# Altium footprint library IC.PcbLib: 386 footprints (part 9 of 30)
Each footprint in its own frame and in the unit in brackets; x right, y up, seen from the top. Pads: shape width x height; smd on the part's side, far side on the other; paste and mask are expansions set on the pad; w line width, h text height; cw(c..) or ccw(c..) is an arc to the next point about the centre after c.
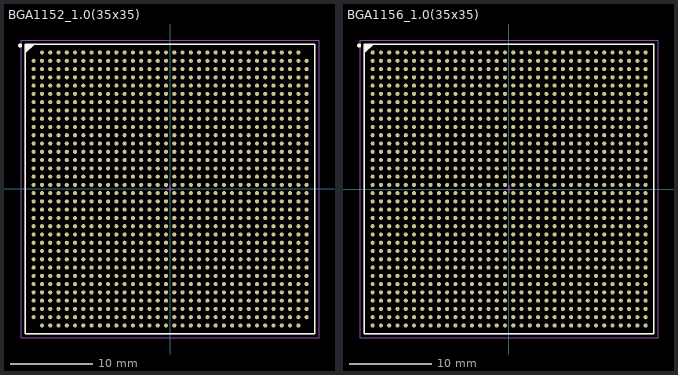
[diagram p8: the footprints below, top view; thin cyan lines are the x and y axes]

## BGA1152_1.0(35x35) [mm]
pads (1152):
  round 0.5 smd: A2(-15.5,16.475) A3(-14.5,16.475) A4(-13.5,16.475) A5(-12.5,16.475) A6(-11.5,16.475) A7(-10.5,16.475) A8(-9.5,16.475) A9(-8.5,16.475) A10(-7.5,16.475) A11(-6.5,16.475) A12(-5.5,16.475) A13(-4.5,16.475) A14(-3.5,16.475) A15(-2.5,16.475) A16(-1.5,16.475) A17(-0.5,16.475) A18(0.5,16.475) A19(1.5,16.475) A20(2.5,16.475) A21(3.5,16.475) A22(4.5,16.475) A23(5.5,16.475) A24(6.5,16.475) A25(7.5,16.475) A26(8.5,16.475) A27(9.5,16.475) A28(10.5,16.475) A29(11.5,16.475) A30(12.5,16.475) A31(13.5,16.475) A32(14.5,16.475) A33(15.5,16.475) AA1(-16.5,-3.525) AA2(-15.5,-3.525) AA3(-14.5,-3.525) AA4(-13.5,-3.525) AA5(-12.5,-3.525) AA6(-11.5,-3.525) AA7(-10.5,-3.525) AA8(-9.5,-3.525) AA9(-8.5,-3.525) AA10(-7.5,-3.525) AA11(-6.5,-3.525) AA12(-5.5,-3.525) AA13(-4.5,-3.525) AA14(-3.5,-3.525) AA15(-2.5,-3.525) AA16(-1.5,-3.525) AA17(-0.5,-3.525) AA18(0.5,-3.525) AA19(1.5,-3.525) AA20(2.5,-3.525) AA21(3.5,-3.525) AA22(4.5,-3.525) AA23(5.5,-3.525) AA24(6.5,-3.525) AA25(7.5,-3.525) AA26(8.5,-3.525) AA27(9.5,-3.525) AA28(10.5,-3.525) AA29(11.5,-3.525) AA30(12.5,-3.525) AA31(13.5,-3.525) AA32(14.5,-3.525) AA33(15.5,-3.525) AA34(16.5,-3.525) AB1(-16.5,-4.525) AB2(-15.5,-4.525) AB3(-14.5,-4.525) AB4(-13.5,-4.525) AB5(-12.5,-4.525) AB6(-11.5,-4.525) AB7(-10.5,-4.525) AB8(-9.5,-4.525) AB9(-8.5,-4.525) AB10(-7.5,-4.525) AB11(-6.5,-4.525) AB12(-5.5,-4.525) AB13(-4.5,-4.525) AB14(-3.5,-4.525) AB15(-2.5,-4.525) AB16(-1.5,-4.525) AB17(-0.5,-4.525) AB18(0.5,-4.525) AB19(1.5,-4.525) AB20(2.5,-4.525) AB21(3.5,-4.525) AB22(4.5,-4.525) AB23(5.5,-4.525) AB24(6.5,-4.525) AB25(7.5,-4.525) AB26(8.5,-4.525) AB27(9.5,-4.525) AB28(10.5,-4.525) AB29(11.5,-4.525) AB30(12.5,-4.525) AB31(13.5,-4.525) AB32(14.5,-4.525) AB33(15.5,-4.525) AB34(16.5,-4.525) AC1(-16.5,-5.525) AC2(-15.5,-5.525) AC3(-14.5,-5.525) AC4(-13.5,-5.525) AC5(-12.5,-5.525) AC6(-11.5,-5.525) AC7(-10.5,-5.525) AC8(-9.5,-5.525) AC9(-8.5,-5.525) AC10(-7.5,-5.525) AC11(-6.5,-5.525) AC12(-5.5,-5.525) AC13(-4.5,-5.525) AC14(-3.5,-5.525) AC15(-2.5,-5.525) AC16(-1.5,-5.525) AC17(-0.5,-5.525) AC18(0.5,-5.525) AC19(1.5,-5.525) AC20(2.5,-5.525) AC21(3.5,-5.525) AC22(4.5,-5.525) AC23(5.5,-5.525) AC24(6.5,-5.525) AC25(7.5,-5.525) AC26(8.5,-5.525) AC27(9.5,-5.525) AC28(10.5,-5.525) AC29(11.5,-5.525) AC30(12.5,-5.525) AC31(13.5,-5.525) AC32(14.5,-5.525) AC33(15.5,-5.525) AC34(16.5,-5.525) AD1(-16.5,-6.525) AD2(-15.5,-6.525) AD3(-14.5,-6.525) AD4(-13.5,-6.525) AD5(-12.5,-6.525) AD6(-11.5,-6.525) AD7(-10.5,-6.525) AD8(-9.5,-6.525) AD9(-8.5,-6.525) AD10(-7.5,-6.525) AD11(-6.5,-6.525) AD12(-5.5,-6.525) AD13(-4.5,-6.525) AD14(-3.5,-6.525) AD15(-2.5,-6.525) AD16(-1.5,-6.525) AD17(-0.5,-6.525) AD18(0.5,-6.525) AD19(1.5,-6.525) AD20(2.5,-6.525) AD21(3.5,-6.525) AD22(4.5,-6.525) AD23(5.5,-6.525) AD24(6.5,-6.525) AD25(7.5,-6.525) AD26(8.5,-6.525) AD27(9.5,-6.525) AD28(10.5,-6.525) AD29(11.5,-6.525) AD30(12.5,-6.525) AD31(13.5,-6.525) AD32(14.5,-6.525) AD33(15.5,-6.525) AD34(16.5,-6.525) AE1(-16.5,-7.525) AE2(-15.5,-7.525) AE3(-14.5,-7.525) AE4(-13.5,-7.525) AE5(-12.5,-7.525) AE6(-11.5,-7.525) AE7(-10.5,-7.525) AE8(-9.5,-7.525) AE9(-8.5,-7.525) AE10(-7.5,-7.525) AE11(-6.5,-7.525) AE12(-5.5,-7.525) AE13(-4.5,-7.525) AE14(-3.5,-7.525) AE15(-2.5,-7.525) AE16(-1.5,-7.525) AE17(-0.5,-7.525) AE18(0.5,-7.525) AE19(1.5,-7.525) AE20(2.5,-7.525) AE21(3.5,-7.525) AE22(4.5,-7.525) AE23(5.5,-7.525) AE24(6.5,-7.525) AE25(7.5,-7.525) AE26(8.5,-7.525) AE27(9.5,-7.525) AE28(10.5,-7.525) AE29(11.5,-7.525) AE30(12.5,-7.525) AE31(13.5,-7.525) AE32(14.5,-7.525) AE33(15.5,-7.525) AE34(16.5,-7.525) AF1(-16.5,-8.525) AF2(-15.5,-8.525) AF3(-14.5,-8.525) AF4(-13.5,-8.525) AF5(-12.5,-8.525) AF6(-11.5,-8.525) AF7(-10.5,-8.525) AF8(-9.5,-8.525) AF9(-8.5,-8.525) AF10(-7.5,-8.525) AF11(-6.5,-8.525) AF12(-5.5,-8.525) AF13(-4.5,-8.525) AF14(-3.5,-8.525) AF15(-2.5,-8.525) AF16(-1.5,-8.525) AF17(-0.5,-8.525) AF18(0.5,-8.525) AF19(1.5,-8.525) AF20(2.5,-8.525) AF21(3.5,-8.525) AF22(4.5,-8.525) AF23(5.5,-8.525) AF24(6.5,-8.525) AF25(7.5,-8.525) AF26(8.5,-8.525) AF27(9.5,-8.525) AF28(10.5,-8.525) AF29(11.5,-8.525) AF30(12.5,-8.525) AF31(13.5,-8.525) AF32(14.5,-8.525) AF33(15.5,-8.525) AF34(16.5,-8.525) AG1(-16.5,-9.525) AG2(-15.5,-9.525) AG3(-14.5,-9.525) AG4(-13.5,-9.525) AG5(-12.5,-9.525) AG6(-11.5,-9.525) AG7(-10.5,-9.525) AG8(-9.5,-9.525) AG9(-8.5,-9.525) AG10(-7.5,-9.525) AG11(-6.5,-9.525) AG12(-5.5,-9.525) AG13(-4.5,-9.525) AG14(-3.5,-9.525) AG15(-2.5,-9.525) AG16(-1.5,-9.525) AG17(-0.5,-9.525) AG18(0.5,-9.525) AG19(1.5,-9.525) AG20(2.5,-9.525) AG21(3.5,-9.525) AG22(4.5,-9.525) AG23(5.5,-9.525) AG24(6.5,-9.525) AG25(7.5,-9.525) AG26(8.5,-9.525) AG27(9.5,-9.525) AG28(10.5,-9.525) AG29(11.5,-9.525) AG30(12.5,-9.525) AG31(13.5,-9.525) AG32(14.5,-9.525) AG33(15.5,-9.525) AG34(16.5,-9.525) AH1(-16.5,-10.525) AH2(-15.5,-10.525) AH3(-14.5,-10.525) AH4(-13.5,-10.525) AH5(-12.5,-10.525) AH6(-11.5,-10.525) AH7(-10.5,-10.525) AH8(-9.5,-10.525) AH9(-8.5,-10.525) AH10(-7.5,-10.525) AH11(-6.5,-10.525) AH12(-5.5,-10.525) AH13(-4.5,-10.525) AH14(-3.5,-10.525) AH15(-2.5,-10.525) AH16(-1.5,-10.525) AH17(-0.5,-10.525) AH18(0.5,-10.525) AH19(1.5,-10.525) AH20(2.5,-10.525) AH21(3.5,-10.525) AH22(4.5,-10.525) AH23(5.5,-10.525) AH24(6.5,-10.525) AH25(7.5,-10.525) AH26(8.5,-10.525) AH27(9.5,-10.525) AH28(10.5,-10.525) AH29(11.5,-10.525) AH30(12.5,-10.525) AH31(13.5,-10.525) AH32(14.5,-10.525) AH33(15.5,-10.525) AH34(16.5,-10.525) AJ1(-16.5,-11.525) AJ2(-15.5,-11.525) AJ3(-14.5,-11.525) AJ4(-13.5,-11.525) AJ5(-12.5,-11.525) AJ6(-11.5,-11.525) AJ7(-10.5,-11.525) AJ8(-9.5,-11.525) AJ9(-8.5,-11.525) AJ10(-7.5,-11.525) AJ11(-6.5,-11.525) AJ12(-5.5,-11.525) AJ13(-4.5,-11.525) AJ14(-3.5,-11.525) AJ15(-2.5,-11.525) AJ16(-1.5,-11.525) AJ17(-0.5,-11.525) AJ18(0.5,-11.525) AJ19(1.5,-11.525) AJ20(2.5,-11.525) AJ21(3.5,-11.525) AJ22(4.5,-11.525) AJ23(5.5,-11.525) AJ24(6.5,-11.525) AJ25(7.5,-11.525) AJ26(8.5,-11.525) AJ27(9.5,-11.525) AJ28(10.5,-11.525) AJ29(11.5,-11.525) AJ30(12.5,-11.525) AJ31(13.5,-11.525) AJ32(14.5,-11.525) AJ33(15.5,-11.525) AJ34(16.5,-11.525) AK1(-16.5,-12.525) AK2(-15.5,-12.525) AK3(-14.5,-12.525) AK4(-13.5,-12.525) AK5(-12.5,-12.525) AK6(-11.5,-12.525) AK7(-10.5,-12.525) AK8(-9.5,-12.525) AK9(-8.5,-12.525) AK10(-7.5,-12.525) AK11(-6.5,-12.525) AK12(-5.5,-12.525) AK13(-4.5,-12.525) AK14(-3.5,-12.525) AK15(-2.5,-12.525) AK16(-1.5,-12.525) AK17(-0.5,-12.525) AK18(0.5,-12.525) AK19(1.5,-12.525) AK20(2.5,-12.525) AK21(3.5,-12.525) AK22(4.5,-12.525) AK23(5.5,-12.525) AK24(6.5,-12.525) AK25(7.5,-12.525) AK26(8.5,-12.525) AK27(9.5,-12.525) AK28(10.5,-12.525) AK29(11.5,-12.525) AK30(12.5,-12.525) AK31(13.5,-12.525) AK32(14.5,-12.525) AK33(15.5,-12.525) AK34(16.5,-12.525) AL1(-16.5,-13.525) AL2(-15.5,-13.525) AL3(-14.5,-13.525) AL4(-13.5,-13.525) AL5(-12.5,-13.525) AL6(-11.5,-13.525) AL7(-10.5,-13.525) AL8(-9.5,-13.525) AL9(-8.5,-13.525) AL10(-7.5,-13.525) AL11(-6.5,-13.525) AL12(-5.5,-13.525) AL13(-4.5,-13.525) AL14(-3.5,-13.525) AL15(-2.5,-13.525) AL16(-1.5,-13.525) AL17(-0.5,-13.525) AL18(0.5,-13.525) AL19(1.5,-13.525) AL20(2.5,-13.525) AL21(3.5,-13.525) AL22(4.5,-13.525) AL23(5.5,-13.525) AL24(6.5,-13.525) AL25(7.5,-13.525) AL26(8.5,-13.525) AL27(9.5,-13.525) AL28(10.5,-13.525) AL29(11.5,-13.525) AL30(12.5,-13.525) AL31(13.5,-13.525) AL32(14.5,-13.525) AL33(15.5,-13.525) AL34(16.5,-13.525) AM1(-16.5,-14.525) AM2(-15.5,-14.525) AM3(-14.5,-14.525) AM4(-13.5,-14.525) AM5(-12.5,-14.525) AM6(-11.5,-14.525) AM7(-10.5,-14.525) AM8(-9.5,-14.525) AM9(-8.5,-14.525) AM10(-7.5,-14.525) AM11(-6.5,-14.525) AM12(-5.5,-14.525) AM13(-4.5,-14.525) AM14(-3.5,-14.525) AM15(-2.5,-14.525) AM16(-1.5,-14.525) AM17(-0.5,-14.525) AM18(0.5,-14.525) AM19(1.5,-14.525) AM20(2.5,-14.525) AM21(3.5,-14.525) AM22(4.5,-14.525) AM23(5.5,-14.525) AM24(6.5,-14.525) AM25(7.5,-14.525) AM26(8.5,-14.525) AM27(9.5,-14.525) AM28(10.5,-14.525) AM29(11.5,-14.525) AM30(12.5,-14.525) AM31(13.5,-14.525) AM32(14.5,-14.525) AM33(15.5,-14.525) AM34(16.5,-14.525) AN1(-16.5,-15.525) AN2(-15.5,-15.525) AN3(-14.5,-15.525) AN4(-13.5,-15.525) AN5(-12.5,-15.525) AN6(-11.5,-15.525) AN7(-10.5,-15.525) AN8(-9.5,-15.525) AN9(-8.5,-15.525) AN10(-7.5,-15.525) AN11(-6.5,-15.525) AN12(-5.5,-15.525) AN13(-4.5,-15.525) AN14(-3.5,-15.525) AN15(-2.5,-15.525) AN16(-1.5,-15.525) AN17(-0.5,-15.525) AN18(0.5,-15.525) AN19(1.5,-15.525) AN20(2.5,-15.525) AN21(3.5,-15.525) AN22(4.5,-15.525) AN23(5.5,-15.525) AN24(6.5,-15.525) AN25(7.5,-15.525) AN26(8.5,-15.525) AN27(9.5,-15.525) AN28(10.5,-15.525) AN29(11.5,-15.525) AN30(12.5,-15.525) AN31(13.5,-15.525) AN32(14.5,-15.525) AN33(15.5,-15.525) AN34(16.5,-15.525) AP2(-15.5,-16.525) AP3(-14.5,-16.525) AP4(-13.5,-16.525) AP5(-12.5,-16.525) AP6(-11.5,-16.525) AP7(-10.5,-16.525) AP8(-9.5,-16.525) AP9(-8.5,-16.525) AP10(-7.5,-16.525) AP11(-6.5,-16.525) AP12(-5.5,-16.525) AP13(-4.5,-16.525) AP14(-3.5,-16.525) AP15(-2.5,-16.525) AP16(-1.5,-16.525) AP17(-0.5,-16.525) AP18(0.5,-16.525) AP19(1.5,-16.525) AP20(2.5,-16.525) AP21(3.5,-16.525) AP22(4.5,-16.525) AP23(5.5,-16.525) AP24(6.5,-16.525) AP25(7.5,-16.525) AP26(8.5,-16.525) AP27(9.5,-16.525) AP28(10.5,-16.525) AP29(11.5,-16.525) AP30(12.5,-16.525) AP31(13.5,-16.525) AP32(14.5,-16.525) AP33(15.5,-16.525) B1(-16.5,15.475) B2(-15.5,15.475) B3(-14.5,15.475) B4(-13.5,15.475) B5(-12.5,15.475) B6(-11.5,15.475) B7(-10.5,15.475) B8(-9.5,15.475) B9(-8.5,15.475) B10(-7.5,15.475) B11(-6.5,15.475) B12(-5.5,15.475) B13(-4.5,15.475) B14(-3.5,15.475) B15(-2.5,15.475) B16(-1.5,15.475) B17(-0.5,15.475) B18(0.5,15.475) B19(1.5,15.475) B20(2.5,15.475) B21(3.5,15.475) B22(4.5,15.475) B23(5.5,15.475) B24(6.5,15.475) B25(7.5,15.475) B26(8.5,15.475) B27(9.5,15.475) B28(10.5,15.475) B29(11.5,15.475) B30(12.5,15.475) B31(13.5,15.475) B32(14.5,15.475) B33(15.5,15.475) B34(16.5,15.475) C1(-16.5,14.475) C2(-15.5,14.475) C3(-14.5,14.475) C4(-13.5,14.475) C5(-12.5,14.475) C6(-11.5,14.475) C7(-10.5,14.475) C8(-9.5,14.475) C9(-8.5,14.475) C10(-7.5,14.475) C11(-6.5,14.475) C12(-5.5,14.475) C13(-4.5,14.475) C14(-3.5,14.475) C15(-2.5,14.475) C16(-1.5,14.475) C17(-0.5,14.475) C18(0.5,14.475) C19(1.5,14.475) C20(2.5,14.475) C21(3.5,14.475) C22(4.5,14.475) C23(5.5,14.475) C24(6.5,14.475) C25(7.5,14.475) C26(8.5,14.475) C27(9.5,14.475) C28(10.5,14.475) C29(11.5,14.475) C30(12.5,14.475) C31(13.5,14.475) C32(14.5,14.475) C33(15.5,14.475) C34(16.5,14.475) D1(-16.5,13.475) D2(-15.5,13.475) D3(-14.5,13.475) D4(-13.5,13.475) D5(-12.5,13.475) D6(-11.5,13.475) D7(-10.5,13.475) D8(-9.5,13.475) D9(-8.5,13.475) D10(-7.5,13.475) D11(-6.5,13.475) D12(-5.5,13.475) D13(-4.5,13.475) D14(-3.5,13.475) D15(-2.5,13.475) D16(-1.5,13.475) D17(-0.5,13.475) D18(0.5,13.475) D19(1.5,13.475) D20(2.5,13.475) D21(3.5,13.475) D22(4.5,13.475) D23(5.5,13.475) D24(6.5,13.475) D25(7.5,13.475) D26(8.5,13.475) D27(9.5,13.475) D28(10.5,13.475) D29(11.5,13.475) D30(12.5,13.475) D31(13.5,13.475) D32(14.5,13.475) D33(15.5,13.475) D34(16.5,13.475) E1(-16.5,12.475) E2(-15.5,12.475) E3(-14.5,12.475) E4(-13.5,12.475) E5(-12.5,12.475) E6(-11.5,12.475) E7(-10.5,12.475) E8(-9.5,12.475) E9(-8.5,12.475) E10(-7.5,12.475) E11(-6.5,12.475) E12(-5.5,12.475) E13(-4.5,12.475) E14(-3.5,12.475) E15(-2.5,12.475) E16(-1.5,12.475) E17(-0.5,12.475) E18(0.5,12.475) E19(1.5,12.475) E20(2.5,12.475) E21(3.5,12.475) E22(4.5,12.475) E23(5.5,12.475) E24(6.5,12.475) E25(7.5,12.475) E26(8.5,12.475) E27(9.5,12.475) E28(10.5,12.475) E29(11.5,12.475) E30(12.5,12.475) E31(13.5,12.475) E32(14.5,12.475) E33(15.5,12.475) E34(16.5,12.475) F1(-16.5,11.475) F2(-15.5,11.475) F3(-14.5,11.475) F4(-13.5,11.475) F5(-12.5,11.475) F6(-11.5,11.475) F7(-10.5,11.475) F8(-9.5,11.475) F9(-8.5,11.475) F10(-7.5,11.475) F11(-6.5,11.475) F12(-5.5,11.475) F13(-4.5,11.475) F14(-3.5,11.475) F15(-2.5,11.475) F16(-1.5,11.475) F17(-0.5,11.475) F18(0.5,11.475) F19(1.5,11.475) F20(2.5,11.475) F21(3.5,11.475) F22(4.5,11.475) F23(5.5,11.475) F24(6.5,11.475) F25(7.5,11.475) F26(8.5,11.475) F27(9.5,11.475) F28(10.5,11.475) F29(11.5,11.475) F30(12.5,11.475) F31(13.5,11.475) F32(14.5,11.475) F33(15.5,11.475) F34(16.5,11.475) G1(-16.5,10.475) G2(-15.5,10.475) G3(-14.5,10.475) G4(-13.5,10.475) G5(-12.5,10.475) G6(-11.5,10.475) G7(-10.5,10.475) G8(-9.5,10.475) G9(-8.5,10.475) G10(-7.5,10.475) G11(-6.5,10.475) G12(-5.5,10.475) G13(-4.5,10.475) G14(-3.5,10.475) G15(-2.5,10.475) G16(-1.5,10.475) G17(-0.5,10.475) G18(0.5,10.475) G19(1.5,10.475) G20(2.5,10.475) G21(3.5,10.475) G22(4.5,10.475) G23(5.5,10.475) G24(6.5,10.475) G25(7.5,10.475) G26(8.5,10.475) G27(9.5,10.475) G28(10.5,10.475) G29(11.5,10.475) G30(12.5,10.475) G31(13.5,10.475) G32(14.5,10.475) G33(15.5,10.475) G34(16.5,10.475) H1(-16.5,9.475) H2(-15.5,9.475) H3(-14.5,9.475) H4(-13.5,9.475) H5(-12.5,9.475) H6(-11.5,9.475) H7(-10.5,9.475) H8(-9.5,9.475) H9(-8.5,9.475) H10(-7.5,9.475) H11(-6.5,9.475) H12(-5.5,9.475) H13(-4.5,9.475) H14(-3.5,9.475) H15(-2.5,9.475) H16(-1.5,9.475) H17(-0.5,9.475) H18(0.5,9.475) H19(1.5,9.475) H20(2.5,9.475) H21(3.5,9.475) H22(4.5,9.475) H23(5.5,9.475) H24(6.5,9.475) H25(7.5,9.475) H26(8.5,9.475) H27(9.5,9.475) H28(10.5,9.475) H29(11.5,9.475) H30(12.5,9.475) H31(13.5,9.475) H32(14.5,9.475) H33(15.5,9.475) H34(16.5,9.475) J1(-16.5,8.475) J2(-15.5,8.475) J3(-14.5,8.475) J4(-13.5,8.475) J5(-12.5,8.475) J6(-11.5,8.475) J7(-10.5,8.475) J8(-9.5,8.475) J9(-8.5,8.475) J10(-7.5,8.475) J11(-6.5,8.475) J12(-5.5,8.475) J13(-4.5,8.475) J14(-3.5,8.475) J15(-2.5,8.475) J16(-1.5,8.475) J17(-0.5,8.475) J18(0.5,8.475) J19(1.5,8.475) J20(2.5,8.475) J21(3.5,8.475) J22(4.5,8.475) J23(5.5,8.475) J24(6.5,8.475) J25(7.5,8.475) J26(8.5,8.475) J27(9.5,8.475) J28(10.5,8.475) J29(11.5,8.475) J30(12.5,8.475) J31(13.5,8.475) J32(14.5,8.475) J33(15.5,8.475) J34(16.5,8.475) K1(-16.5,7.475) K2(-15.5,7.475) K3(-14.5,7.475) K4(-13.5,7.475) K5(-12.5,7.475) K6(-11.5,7.475) K7(-10.5,7.475) K8(-9.5,7.475) K9(-8.5,7.475) K10(-7.5,7.475) K11(-6.5,7.475) K12(-5.5,7.475) K13(-4.5,7.475) K14(-3.5,7.475) K15(-2.5,7.475) K16(-1.5,7.475) K17(-0.5,7.475) K18(0.5,7.475) K19(1.5,7.475) K20(2.5,7.475) K21(3.5,7.475) K22(4.5,7.475) K23(5.5,7.475) K24(6.5,7.475) K25(7.5,7.475) K26(8.5,7.475) K27(9.5,7.475) K28(10.5,7.475) K29(11.5,7.475) K30(12.5,7.475) K31(13.5,7.475) K32(14.5,7.475) K33(15.5,7.475) K34(16.5,7.475) L1(-16.5,6.475) L2(-15.5,6.475) L3(-14.5,6.475) L4(-13.5,6.475) L5(-12.5,6.475) L6(-11.5,6.475) L7(-10.5,6.475) L8(-9.5,6.475) L9(-8.5,6.475) L10(-7.5,6.475) L11(-6.5,6.475) L12(-5.5,6.475) L13(-4.5,6.475) L14(-3.5,6.475) L15(-2.5,6.475) L16(-1.5,6.475) L17(-0.5,6.475) L18(0.5,6.475) L19(1.5,6.475) L20(2.5,6.475) L21(3.5,6.475) L22(4.5,6.475) L23(5.5,6.475) L24(6.5,6.475) L25(7.5,6.475) L26(8.5,6.475) L27(9.5,6.475) L28(10.5,6.475) L29(11.5,6.475) L30(12.5,6.475) L31(13.5,6.475) L32(14.5,6.475) L33(15.5,6.475) L34(16.5,6.475) M1(-16.5,5.475) M2(-15.5,5.475) M3(-14.5,5.475) M4(-13.5,5.475) M5(-12.5,5.475) M6(-11.5,5.475) M7(-10.5,5.475) M8(-9.5,5.475) M9(-8.5,5.475) M10(-7.5,5.475) M11(-6.5,5.475) M12(-5.5,5.475) M13(-4.5,5.475) M14(-3.5,5.475) M15(-2.5,5.475) M16(-1.5,5.475) M17(-0.5,5.475) M18(0.5,5.475) M19(1.5,5.475) M20(2.5,5.475) M21(3.5,5.475) M22(4.5,5.475) M23(5.5,5.475) M24(6.5,5.475) M25(7.5,5.475) M26(8.5,5.475) M27(9.5,5.475) M28(10.5,5.475) M29(11.5,5.475) M30(12.5,5.475) M31(13.5,5.475) M32(14.5,5.475) M33(15.5,5.475) M34(16.5,5.475) N1(-16.5,4.475) N2(-15.5,4.475) N3(-14.5,4.475) N4(-13.5,4.475) N5(-12.5,4.475) N6(-11.5,4.475) N7(-10.5,4.475) N8(-9.5,4.475) N9(-8.5,4.475) N10(-7.5,4.475) N11(-6.5,4.475) N12(-5.5,4.475) N13(-4.5,4.475) N14(-3.5,4.475) N15(-2.5,4.475) N16(-1.5,4.475) N17(-0.5,4.475) N18(0.5,4.475) N19(1.5,4.475) N20(2.5,4.475) N21(3.5,4.475) N22(4.5,4.475) N23(5.5,4.475) N24(6.5,4.475) N25(7.5,4.475) N26(8.5,4.475) N27(9.5,4.475) N28(10.5,4.475) N29(11.5,4.475) N30(12.5,4.475) N31(13.5,4.475) N32(14.5,4.475) N33(15.5,4.475) N34(16.5,4.475) P1(-16.5,3.475) P2(-15.5,3.475) P3(-14.5,3.475) P4(-13.5,3.475) P5(-12.5,3.475) P6(-11.5,3.475) P7(-10.5,3.475) P8(-9.5,3.475) P9(-8.5,3.475) P10(-7.5,3.475) P11(-6.5,3.475) P12(-5.5,3.475) P13(-4.5,3.475) P14(-3.5,3.475) P15(-2.5,3.475) P16(-1.5,3.475) P17(-0.5,3.475) P18(0.5,3.475) P19(1.5,3.475) P20(2.5,3.475) P21(3.5,3.475) P22(4.5,3.475) P23(5.5,3.475) P24(6.5,3.475) P25(7.5,3.475) P26(8.5,3.475) P27(9.5,3.475) P28(10.5,3.475) P29(11.5,3.475) P30(12.5,3.475) P31(13.5,3.475) P32(14.5,3.475) P33(15.5,3.475) P34(16.5,3.475) R1(-16.5,2.475) R2(-15.5,2.475) R3(-14.5,2.475) R4(-13.5,2.475) R5(-12.5,2.475) R6(-11.5,2.475) R7(-10.5,2.475) R8(-9.5,2.475) R9(-8.5,2.475) R10(-7.5,2.475) R11(-6.5,2.475) R12(-5.5,2.475) R13(-4.5,2.475) R14(-3.5,2.475) R15(-2.5,2.475) R16(-1.5,2.475) R17(-0.5,2.475) R18(0.5,2.475) R19(1.5,2.475) R20(2.5,2.475) R21(3.5,2.475) R22(4.5,2.475) R23(5.5,2.475) R24(6.5,2.475) R25(7.5,2.475) R26(8.5,2.475) R27(9.5,2.475) R28(10.5,2.475) R29(11.5,2.475) R30(12.5,2.475) R31(13.5,2.475) R32(14.5,2.475) R33(15.5,2.475) R34(16.5,2.475) T1(-16.5,1.475) T2(-15.5,1.475) T3(-14.5,1.475) T4(-13.5,1.475) T5(-12.5,1.475) T6(-11.5,1.475) T7(-10.5,1.475) T8(-9.5,1.475) T9(-8.5,1.475) T10(-7.5,1.475) T11(-6.5,1.475) T12(-5.5,1.475) T13(-4.5,1.475) T14(-3.5,1.475) T15(-2.5,1.475) T16(-1.5,1.475) T17(-0.5,1.475) T18(0.5,1.475) T19(1.5,1.475) T20(2.5,1.475) T21(3.5,1.475) T22(4.5,1.475) T23(5.5,1.475) T24(6.5,1.475) T25(7.5,1.475) T26(8.5,1.475) T27(9.5,1.475) T28(10.5,1.475) T29(11.5,1.475) T30(12.5,1.475) T31(13.5,1.475) T32(14.5,1.475) T33(15.5,1.475) T34(16.5,1.475) U1(-16.5,0.475) U2(-15.5,0.475) U3(-14.5,0.475) U4(-13.5,0.475) U5(-12.5,0.475) U6(-11.5,0.475) U7(-10.5,0.475) U8(-9.5,0.475) U9(-8.5,0.475) U10(-7.5,0.475) U11(-6.5,0.475) U12(-5.5,0.475) U13(-4.5,0.475) U14(-3.5,0.475) U15(-2.5,0.475) U16(-1.5,0.475) U17(-0.5,0.475) U18(0.5,0.475) U19(1.5,0.475) U20(2.5,0.475) U21(3.5,0.475) U22(4.5,0.475) U23(5.5,0.475) U24(6.5,0.475) U25(7.5,0.475) U26(8.5,0.475) U27(9.5,0.475) U28(10.5,0.475) U29(11.5,0.475) U30(12.5,0.475) U31(13.5,0.475) U32(14.5,0.475) U33(15.5,0.475) U34(16.5,0.475) V1(-16.5,-0.525) V2(-15.5,-0.525) V3(-14.5,-0.525) V4(-13.5,-0.525) V5(-12.5,-0.525) V6(-11.5,-0.525) V7(-10.5,-0.525) V8(-9.5,-0.525) V9(-8.5,-0.525) V10(-7.5,-0.525) V11(-6.5,-0.525) V12(-5.5,-0.525) V13(-4.5,-0.525) V14(-3.5,-0.525) V15(-2.5,-0.525) V16(-1.5,-0.525) V17(-0.5,-0.525) V18(0.5,-0.525) V19(1.5,-0.525) V20(2.5,-0.525) V21(3.5,-0.525) V22(4.5,-0.525) V23(5.5,-0.525) V24(6.5,-0.525) V25(7.5,-0.525) V26(8.5,-0.525) V27(9.5,-0.525) V28(10.5,-0.525) V29(11.5,-0.525) V30(12.5,-0.525) V31(13.5,-0.525) V32(14.5,-0.525) V33(15.5,-0.525) V34(16.5,-0.525) W1(-16.5,-1.525) W2(-15.5,-1.525) W3(-14.5,-1.525) W4(-13.5,-1.525) W5(-12.5,-1.525) W6(-11.5,-1.525) W7(-10.5,-1.525) W8(-9.5,-1.525) W9(-8.5,-1.525) W10(-7.5,-1.525) W11(-6.5,-1.525) W12(-5.5,-1.525) W13(-4.5,-1.525) W14(-3.5,-1.525) W15(-2.5,-1.525) W16(-1.5,-1.525) W17(-0.5,-1.525) W18(0.5,-1.525) W19(1.5,-1.525) W20(2.5,-1.525) W21(3.5,-1.525) W22(4.5,-1.525) W23(5.5,-1.525) W24(6.5,-1.525) W25(7.5,-1.525) W26(8.5,-1.525) W27(9.5,-1.525) W28(10.5,-1.525) W29(11.5,-1.525) W30(12.5,-1.525) W31(13.5,-1.525) W32(14.5,-1.525) W33(15.5,-1.525) W34(16.5,-1.525) Y1(-16.5,-2.525) Y2(-15.5,-2.525) Y3(-14.5,-2.525) Y4(-13.5,-2.525) Y5(-12.5,-2.525) Y6(-11.5,-2.525) Y7(-10.5,-2.525) Y8(-9.5,-2.525) Y9(-8.5,-2.525) Y10(-7.5,-2.525) Y11(-6.5,-2.525) Y12(-5.5,-2.525) Y13(-4.5,-2.525) Y14(-3.5,-2.525) Y15(-2.5,-2.525) Y16(-1.5,-2.525) Y17(-0.5,-2.525) Y18(0.5,-2.525) Y19(1.5,-2.525) Y20(2.5,-2.525) Y21(3.5,-2.525) Y22(4.5,-2.525) Y23(5.5,-2.525) Y24(6.5,-2.525) Y25(7.5,-2.525) Y26(8.5,-2.525) Y27(9.5,-2.525) Y28(10.5,-2.525) Y29(11.5,-2.525) Y30(12.5,-2.525) Y31(13.5,-2.525) Y32(14.5,-2.525) Y33(15.5,-2.525) Y34(16.5,-2.525)
Top Overlay:
  circle w0.25: c-18.15,17.325 r0.125
  region: -16.5,17.475 -17.5,16.475 -17.5,17.475
  lines w0.2: -17.5,16.475 -16.5,17.475 ; -17.5,-17.525 17.5,-17.525 17.5,17.475 -17.5,17.475 -17.5,-17.525
Mechanical 13:
  lines w0.1: -17.5,-17.525 17.5,-17.525 17.5,17.475 -17.5,17.475 -17.5,-17.525
Mechanical 15:
  lines w0.05: -18,-18.025 18,-18.025 18,17.975 -18,17.975 -18,-18.025
  lines w0.1: -0.5,-0.025 0.5,-0.025 ; 0,-0.525 0,0.475
3D body "User Library-FBGA 1152.step": height 2.35, standoff 0.05, extent -17.449,-17.525 17.551,17.475

## BGA1156_1.0(35x35) [mm]
height 0.65
pads (1156):
  round 0.5 smd: A1(-16.475,16.525) A2(-15.475,16.525) A3(-14.475,16.525) A4(-13.475,16.525) A5(-12.475,16.525) A6(-11.475,16.525) A7(-10.475,16.525) A8(-9.475,16.525) A9(-8.475,16.525) A10(-7.475,16.525) A11(-6.475,16.525) A12(-5.475,16.525) A13(-4.475,16.525) A14(-3.475,16.525) A15(-2.475,16.525) A16(-1.475,16.525) A17(-0.475,16.525) A18(0.525,16.525) A19(1.525,16.525) A20(2.525,16.525) A21(3.525,16.525) A22(4.525,16.525) A23(5.525,16.525) A24(6.525,16.525) A25(7.525,16.525) A26(8.525,16.525) A27(9.525,16.525) A28(10.525,16.525) A29(11.525,16.525) A30(12.525,16.525) A31(13.525,16.525) A32(14.525,16.525) A33(15.525,16.525) A34(16.525,16.525) AA1(-16.475,-3.475) AA2(-15.475,-3.475) AA3(-14.475,-3.475) AA4(-13.475,-3.475) AA5(-12.475,-3.475) AA6(-11.475,-3.475) AA7(-10.475,-3.475) AA8(-9.475,-3.475) AA9(-8.475,-3.475) AA10(-7.475,-3.475) AA11(-6.475,-3.475) AA12(-5.475,-3.475) AA13(-4.475,-3.475) AA14(-3.475,-3.475) AA15(-2.475,-3.475) AA16(-1.475,-3.475) AA17(-0.475,-3.475) AA18(0.525,-3.475) AA19(1.525,-3.475) AA20(2.525,-3.475) AA21(3.525,-3.475) AA22(4.525,-3.475) AA23(5.525,-3.475) AA24(6.525,-3.475) AA25(7.525,-3.475) AA26(8.525,-3.475) AA27(9.525,-3.475) AA28(10.525,-3.475) AA29(11.525,-3.475) AA30(12.525,-3.475) AA31(13.525,-3.475) AA32(14.525,-3.475) AA33(15.525,-3.475) AA34(16.525,-3.475) AB1(-16.475,-4.475) AB2(-15.475,-4.475) AB3(-14.475,-4.475) AB4(-13.475,-4.475) AB5(-12.475,-4.475) AB6(-11.475,-4.475) AB7(-10.475,-4.475) AB8(-9.475,-4.475) AB9(-8.475,-4.475) AB10(-7.475,-4.475) AB11(-6.475,-4.475) AB12(-5.475,-4.475) AB13(-4.475,-4.475) AB14(-3.475,-4.475) AB15(-2.475,-4.475) AB16(-1.475,-4.475) AB17(-0.475,-4.475) AB18(0.525,-4.475) AB19(1.525,-4.475) AB20(2.525,-4.475) AB21(3.525,-4.475) AB22(4.525,-4.475) AB23(5.525,-4.475) AB24(6.525,-4.475) AB25(7.525,-4.475) AB26(8.525,-4.475) AB27(9.525,-4.475) AB28(10.525,-4.475) AB29(11.525,-4.475) AB30(12.525,-4.475) AB31(13.525,-4.475) AB32(14.525,-4.475) AB33(15.525,-4.475) AB34(16.525,-4.475) AC1(-16.475,-5.475) AC2(-15.475,-5.475) AC3(-14.475,-5.475) AC4(-13.475,-5.475) AC5(-12.475,-5.475) AC6(-11.475,-5.475) AC7(-10.475,-5.475) AC8(-9.475,-5.475) AC9(-8.475,-5.475) AC10(-7.475,-5.475) AC11(-6.475,-5.475) AC12(-5.475,-5.475) AC13(-4.475,-5.475) AC14(-3.475,-5.475) AC15(-2.475,-5.475) AC16(-1.475,-5.475) AC17(-0.475,-5.475) AC18(0.525,-5.475) AC19(1.525,-5.475) AC20(2.525,-5.475) AC21(3.525,-5.475) AC22(4.525,-5.475) AC23(5.525,-5.475) AC24(6.525,-5.475) AC25(7.525,-5.475) AC26(8.525,-5.475) AC27(9.525,-5.475) AC28(10.525,-5.475) AC29(11.525,-5.475) AC30(12.525,-5.475) AC31(13.525,-5.475) AC32(14.525,-5.475) AC33(15.525,-5.475) AC34(16.525,-5.475) AD1(-16.475,-6.475) AD2(-15.475,-6.475) AD3(-14.475,-6.475) AD4(-13.475,-6.475) AD5(-12.475,-6.475) AD6(-11.475,-6.475) AD7(-10.475,-6.475) AD8(-9.475,-6.475) AD9(-8.475,-6.475) AD10(-7.475,-6.475) AD11(-6.475,-6.475) AD12(-5.475,-6.475) AD13(-4.475,-6.475) AD14(-3.475,-6.475) AD15(-2.475,-6.475) AD16(-1.475,-6.475) AD17(-0.475,-6.475) AD18(0.525,-6.475) AD19(1.525,-6.475) AD20(2.525,-6.475) AD21(3.525,-6.475) AD22(4.525,-6.475) AD23(5.525,-6.475) AD24(6.525,-6.475) AD25(7.525,-6.475) AD26(8.525,-6.475) AD27(9.525,-6.475) AD28(10.525,-6.475) AD29(11.525,-6.475) AD30(12.525,-6.475) AD31(13.525,-6.475) AD32(14.525,-6.475) AD33(15.525,-6.475) AD34(16.525,-6.475) AE1(-16.475,-7.475) AE2(-15.475,-7.475) AE3(-14.475,-7.475) AE4(-13.475,-7.475) AE5(-12.475,-7.475) AE6(-11.475,-7.475) AE7(-10.475,-7.475) AE8(-9.475,-7.475) AE9(-8.475,-7.475) AE10(-7.475,-7.475) AE11(-6.475,-7.475) AE12(-5.475,-7.475) AE13(-4.475,-7.475) AE14(-3.475,-7.475) AE15(-2.475,-7.475) AE16(-1.475,-7.475) AE17(-0.475,-7.475) AE18(0.525,-7.475) AE19(1.525,-7.475) AE20(2.525,-7.475) AE21(3.525,-7.475) AE22(4.525,-7.475) AE23(5.525,-7.475) AE24(6.525,-7.475) AE25(7.525,-7.475) AE26(8.525,-7.475) AE27(9.525,-7.475) AE28(10.525,-7.475) AE29(11.525,-7.475) AE30(12.525,-7.475) AE31(13.525,-7.475) AE32(14.525,-7.475) AE33(15.525,-7.475) AE34(16.525,-7.475) AF1(-16.475,-8.475) AF2(-15.475,-8.475) AF3(-14.475,-8.475) AF4(-13.475,-8.475) AF5(-12.475,-8.475) AF6(-11.475,-8.475) AF7(-10.475,-8.475) AF8(-9.475,-8.475) AF9(-8.475,-8.475) AF10(-7.475,-8.475) AF11(-6.475,-8.475) AF12(-5.475,-8.475) AF13(-4.475,-8.475) AF14(-3.475,-8.475) AF15(-2.475,-8.475) AF16(-1.475,-8.475) AF17(-0.475,-8.475) AF18(0.525,-8.475) AF19(1.525,-8.475) AF20(2.525,-8.475) AF21(3.525,-8.475) AF22(4.525,-8.475) AF23(5.525,-8.475) AF24(6.525,-8.475) AF25(7.525,-8.475) AF26(8.525,-8.475) AF27(9.525,-8.475) AF28(10.525,-8.475) AF29(11.525,-8.475) AF30(12.525,-8.475) AF31(13.525,-8.475) AF32(14.525,-8.475) AF33(15.525,-8.475) AF34(16.525,-8.475) AG1(-16.475,-9.475) AG2(-15.475,-9.475) AG3(-14.475,-9.475) AG4(-13.475,-9.475) AG5(-12.475,-9.475) AG6(-11.475,-9.475) AG7(-10.475,-9.475) AG8(-9.475,-9.475) AG9(-8.475,-9.475) AG10(-7.475,-9.475) AG11(-6.475,-9.475) AG12(-5.475,-9.475) AG13(-4.475,-9.475) AG14(-3.475,-9.475) AG15(-2.475,-9.475) AG16(-1.475,-9.475) AG17(-0.475,-9.475) AG18(0.525,-9.475) AG19(1.525,-9.475) AG20(2.525,-9.475) AG21(3.525,-9.475) AG22(4.525,-9.475) AG23(5.525,-9.475) AG24(6.525,-9.475) AG25(7.525,-9.475) AG26(8.525,-9.475) AG27(9.525,-9.475) AG28(10.525,-9.475) AG29(11.525,-9.475) AG30(12.525,-9.475) AG31(13.525,-9.475) AG32(14.525,-9.475) AG33(15.525,-9.475) AG34(16.525,-9.475) AH1(-16.475,-10.475) AH2(-15.475,-10.475) AH3(-14.475,-10.475) AH4(-13.475,-10.475) AH5(-12.475,-10.475) AH6(-11.475,-10.475) AH7(-10.475,-10.475) AH8(-9.475,-10.475) AH9(-8.475,-10.475) AH10(-7.475,-10.475) AH11(-6.475,-10.475) AH12(-5.475,-10.475) AH13(-4.475,-10.475) AH14(-3.475,-10.475) AH15(-2.475,-10.475) AH16(-1.475,-10.475) AH17(-0.475,-10.475) AH18(0.525,-10.475) AH19(1.525,-10.475) AH20(2.525,-10.475) AH21(3.525,-10.475) AH22(4.525,-10.475) AH23(5.525,-10.475) AH24(6.525,-10.475) AH25(7.525,-10.475) AH26(8.525,-10.475) AH27(9.525,-10.475) AH28(10.525,-10.475) AH29(11.525,-10.475) AH30(12.525,-10.475) AH31(13.525,-10.475) AH32(14.525,-10.475) AH33(15.525,-10.475) AH34(16.525,-10.475) AJ1(-16.475,-11.475) AJ2(-15.475,-11.475) AJ3(-14.475,-11.475) AJ4(-13.475,-11.475) AJ5(-12.475,-11.475) AJ6(-11.475,-11.475) AJ7(-10.475,-11.475) AJ8(-9.475,-11.475) AJ9(-8.475,-11.475) AJ10(-7.475,-11.475) AJ11(-6.475,-11.475) AJ12(-5.475,-11.475) AJ13(-4.475,-11.475) AJ14(-3.475,-11.475) AJ15(-2.475,-11.475) AJ16(-1.475,-11.475) AJ17(-0.475,-11.475) AJ18(0.525,-11.475) AJ19(1.525,-11.475) AJ20(2.525,-11.475) AJ21(3.525,-11.475) AJ22(4.525,-11.475) AJ23(5.525,-11.475) AJ24(6.525,-11.475) AJ25(7.525,-11.475) AJ26(8.525,-11.475) AJ27(9.525,-11.475) AJ28(10.525,-11.475) AJ29(11.525,-11.475) AJ30(12.525,-11.475) AJ31(13.525,-11.475) AJ32(14.525,-11.475) AJ33(15.525,-11.475) AJ34(16.525,-11.475) AK1(-16.475,-12.475) AK2(-15.475,-12.475) AK3(-14.475,-12.475) AK4(-13.475,-12.475) AK5(-12.475,-12.475) AK6(-11.475,-12.475) AK7(-10.475,-12.475) AK8(-9.475,-12.475) AK9(-8.475,-12.475) AK10(-7.475,-12.475) AK11(-6.475,-12.475) AK12(-5.475,-12.475) AK13(-4.475,-12.475) AK14(-3.475,-12.475) AK15(-2.475,-12.475) AK16(-1.475,-12.475) AK17(-0.475,-12.475) AK18(0.525,-12.475) AK19(1.525,-12.475) AK20(2.525,-12.475) AK21(3.525,-12.475) AK22(4.525,-12.475) AK23(5.525,-12.475) AK24(6.525,-12.475) AK25(7.525,-12.475) AK26(8.525,-12.475) AK27(9.525,-12.475) AK28(10.525,-12.475) AK29(11.525,-12.475) AK30(12.525,-12.475) AK31(13.525,-12.475) AK32(14.525,-12.475) AK33(15.525,-12.475) AK34(16.525,-12.475) AL1(-16.475,-13.475) AL2(-15.475,-13.475) AL3(-14.475,-13.475) AL4(-13.475,-13.475) AL5(-12.475,-13.475) AL6(-11.475,-13.475) AL7(-10.475,-13.475) AL8(-9.475,-13.475) AL9(-8.475,-13.475) AL10(-7.475,-13.475) AL11(-6.475,-13.475) AL12(-5.475,-13.475) AL13(-4.475,-13.475) AL14(-3.475,-13.475) AL15(-2.475,-13.475) AL16(-1.475,-13.475) AL17(-0.475,-13.475) AL18(0.525,-13.475) AL19(1.525,-13.475) AL20(2.525,-13.475) AL21(3.525,-13.475) AL22(4.525,-13.475) AL23(5.525,-13.475) AL24(6.525,-13.475) AL25(7.525,-13.475) AL26(8.525,-13.475) AL27(9.525,-13.475) AL28(10.525,-13.475) AL29(11.525,-13.475) AL30(12.525,-13.475) AL31(13.525,-13.475) AL32(14.525,-13.475) AL33(15.525,-13.475) AL34(16.525,-13.475) AM1(-16.475,-14.475) AM2(-15.475,-14.475) AM3(-14.475,-14.475) AM4(-13.475,-14.475) AM5(-12.475,-14.475) AM6(-11.475,-14.475) AM7(-10.475,-14.475) AM8(-9.475,-14.475) AM9(-8.475,-14.475) AM10(-7.475,-14.475) AM11(-6.475,-14.475) AM12(-5.475,-14.475) AM13(-4.475,-14.475) AM14(-3.475,-14.475) AM15(-2.475,-14.475) AM16(-1.475,-14.475) AM17(-0.475,-14.475) AM18(0.525,-14.475) AM19(1.525,-14.475) AM20(2.525,-14.475) AM21(3.525,-14.475) AM22(4.525,-14.475) AM23(5.525,-14.475) AM24(6.525,-14.475) AM25(7.525,-14.475) AM26(8.525,-14.475) AM27(9.525,-14.475) AM28(10.525,-14.475) AM29(11.525,-14.475) AM30(12.525,-14.475) AM31(13.525,-14.475) AM32(14.525,-14.475) AM33(15.525,-14.475) AM34(16.525,-14.475) AN1(-16.475,-15.475) AN2(-15.475,-15.475) AN3(-14.475,-15.475) AN4(-13.475,-15.475) AN5(-12.475,-15.475) AN6(-11.475,-15.475) AN7(-10.475,-15.475) AN8(-9.475,-15.475) AN9(-8.475,-15.475) AN10(-7.475,-15.475) AN11(-6.475,-15.475) AN12(-5.475,-15.475) AN13(-4.475,-15.475) AN14(-3.475,-15.475) AN15(-2.475,-15.475) AN16(-1.475,-15.475) AN17(-0.475,-15.475) AN18(0.525,-15.475) AN19(1.525,-15.475) AN20(2.525,-15.475) AN21(3.525,-15.475) AN22(4.525,-15.475) AN23(5.525,-15.475) AN24(6.525,-15.475) AN25(7.525,-15.475) AN26(8.525,-15.475) AN27(9.525,-15.475) AN28(10.525,-15.475) AN29(11.525,-15.475) AN30(12.525,-15.475) AN31(13.525,-15.475) AN32(14.525,-15.475) AN33(15.525,-15.475) AN34(16.525,-15.475) AP1(-16.475,-16.475) AP2(-15.475,-16.475) AP3(-14.475,-16.475) AP4(-13.475,-16.475) AP5(-12.475,-16.475) AP6(-11.475,-16.475) AP7(-10.475,-16.475) AP8(-9.475,-16.475) AP9(-8.475,-16.475) AP10(-7.475,-16.475) AP11(-6.475,-16.475) AP12(-5.475,-16.475) AP13(-4.475,-16.475) AP14(-3.475,-16.475) AP15(-2.475,-16.475) AP16(-1.475,-16.475) AP17(-0.475,-16.475) AP18(0.525,-16.475) AP19(1.525,-16.475) AP20(2.525,-16.475) AP21(3.525,-16.475) AP22(4.525,-16.475) AP23(5.525,-16.475) AP24(6.525,-16.475) AP25(7.525,-16.475) AP26(8.525,-16.475) AP27(9.525,-16.475) AP28(10.525,-16.475) AP29(11.525,-16.475) AP30(12.525,-16.475) AP31(13.525,-16.475) AP32(14.525,-16.475) AP33(15.525,-16.475) AP34(16.525,-16.475) B1(-16.475,15.525) B2(-15.475,15.525) B3(-14.475,15.525) B4(-13.475,15.525) B5(-12.475,15.525) B6(-11.475,15.525) B7(-10.475,15.525) B8(-9.475,15.525) B9(-8.475,15.525) B10(-7.475,15.525) B11(-6.475,15.525) B12(-5.475,15.525) B13(-4.475,15.525) B14(-3.475,15.525) B15(-2.475,15.525) B16(-1.475,15.525) B17(-0.475,15.525) B18(0.525,15.525) B19(1.525,15.525) B20(2.525,15.525) B21(3.525,15.525) B22(4.525,15.525) B23(5.525,15.525) B24(6.525,15.525) B25(7.525,15.525) B26(8.525,15.525) B27(9.525,15.525) B28(10.525,15.525) B29(11.525,15.525) B30(12.525,15.525) B31(13.525,15.525) B32(14.525,15.525) B33(15.525,15.525) B34(16.525,15.525) C1(-16.475,14.525) C2(-15.475,14.525) C3(-14.475,14.525) C4(-13.475,14.525) C5(-12.475,14.525) C6(-11.475,14.525) C7(-10.475,14.525) C8(-9.475,14.525) C9(-8.475,14.525) C10(-7.475,14.525) C11(-6.475,14.525) C12(-5.475,14.525) C13(-4.475,14.525) C14(-3.475,14.525) C15(-2.475,14.525) C16(-1.475,14.525) C17(-0.475,14.525) C18(0.525,14.525) C19(1.525,14.525) C20(2.525,14.525) C21(3.525,14.525) C22(4.525,14.525) C23(5.525,14.525) C24(6.525,14.525) C25(7.525,14.525) C26(8.525,14.525) C27(9.525,14.525) C28(10.525,14.525) C29(11.525,14.525) C30(12.525,14.525) C31(13.525,14.525) C32(14.525,14.525) C33(15.525,14.525) C34(16.525,14.525) D1(-16.475,13.525) D2(-15.475,13.525) D3(-14.475,13.525) D4(-13.475,13.525) D5(-12.475,13.525) D6(-11.475,13.525) D7(-10.475,13.525) D8(-9.475,13.525) D9(-8.475,13.525) D10(-7.475,13.525) D11(-6.475,13.525) D12(-5.475,13.525) D13(-4.475,13.525) D14(-3.475,13.525) D15(-2.475,13.525) D16(-1.475,13.525) D17(-0.475,13.525) D18(0.525,13.525) D19(1.525,13.525) D20(2.525,13.525) D21(3.525,13.525) D22(4.525,13.525) D23(5.525,13.525) D24(6.525,13.525) D25(7.525,13.525) D26(8.525,13.525) D27(9.525,13.525) D28(10.525,13.525) D29(11.525,13.525) D30(12.525,13.525) D31(13.525,13.525) D32(14.525,13.525) D33(15.525,13.525) D34(16.525,13.525) E1(-16.475,12.525) E2(-15.475,12.525) E3(-14.475,12.525) E4(-13.475,12.525) E5(-12.475,12.525) E6(-11.475,12.525) E7(-10.475,12.525) E8(-9.475,12.525) E9(-8.475,12.525) E10(-7.475,12.525) E11(-6.475,12.525) E12(-5.475,12.525) E13(-4.475,12.525) E14(-3.475,12.525) E15(-2.475,12.525) E16(-1.475,12.525) E17(-0.475,12.525) E18(0.525,12.525) E19(1.525,12.525) E20(2.525,12.525) E21(3.525,12.525) E22(4.525,12.525) E23(5.525,12.525) E24(6.525,12.525) E25(7.525,12.525) E26(8.525,12.525) E27(9.525,12.525) E28(10.525,12.525) E29(11.525,12.525) E30(12.525,12.525) E31(13.525,12.525) E32(14.525,12.525) E33(15.525,12.525) E34(16.525,12.525) F1(-16.475,11.525) F2(-15.475,11.525) F3(-14.475,11.525) F4(-13.475,11.525) F5(-12.475,11.525) F6(-11.475,11.525) F7(-10.475,11.525) F8(-9.475,11.525) F9(-8.475,11.525) F10(-7.475,11.525) F11(-6.475,11.525) F12(-5.475,11.525) F13(-4.475,11.525) F14(-3.475,11.525) F15(-2.475,11.525) F16(-1.475,11.525) F17(-0.475,11.525) F18(0.525,11.525) F19(1.525,11.525) F20(2.525,11.525) F21(3.525,11.525) F22(4.525,11.525) F23(5.525,11.525) F24(6.525,11.525) F25(7.525,11.525) F26(8.525,11.525) F27(9.525,11.525) F28(10.525,11.525) F29(11.525,11.525) F30(12.525,11.525) F31(13.525,11.525) F32(14.525,11.525) F33(15.525,11.525) F34(16.525,11.525) G1(-16.475,10.525) G2(-15.475,10.525) G3(-14.475,10.525) G4(-13.475,10.525) G5(-12.475,10.525) G6(-11.475,10.525) G7(-10.475,10.525) G8(-9.475,10.525) G9(-8.475,10.525) G10(-7.475,10.525) G11(-6.475,10.525) G12(-5.475,10.525) G13(-4.475,10.525) G14(-3.475,10.525) G15(-2.475,10.525) G16(-1.475,10.525) G17(-0.475,10.525) G18(0.525,10.525) G19(1.525,10.525) G20(2.525,10.525) G21(3.525,10.525) G22(4.525,10.525) G23(5.525,10.525) G24(6.525,10.525) G25(7.525,10.525) G26(8.525,10.525) G27(9.525,10.525) G28(10.525,10.525) G29(11.525,10.525) G30(12.525,10.525) G31(13.525,10.525) G32(14.525,10.525) G33(15.525,10.525) G34(16.525,10.525) H1(-16.475,9.525) H2(-15.475,9.525) H3(-14.475,9.525) H4(-13.475,9.525) H5(-12.475,9.525) H6(-11.475,9.525) H7(-10.475,9.525) H8(-9.475,9.525) H9(-8.475,9.525) H10(-7.475,9.525) H11(-6.475,9.525) H12(-5.475,9.525) H13(-4.475,9.525) H14(-3.475,9.525) H15(-2.475,9.525) H16(-1.475,9.525) H17(-0.475,9.525) H18(0.525,9.525) H19(1.525,9.525) H20(2.525,9.525) H21(3.525,9.525) H22(4.525,9.525) H23(5.525,9.525) H24(6.525,9.525) H25(7.525,9.525) H26(8.525,9.525) H27(9.525,9.525) H28(10.525,9.525) H29(11.525,9.525) H30(12.525,9.525) H31(13.525,9.525) H32(14.525,9.525) H33(15.525,9.525) H34(16.525,9.525) J1(-16.475,8.525) J2(-15.475,8.525) J3(-14.475,8.525) J4(-13.475,8.525) J5(-12.475,8.525) J6(-11.475,8.525) J7(-10.475,8.525) J8(-9.475,8.525) J9(-8.475,8.525) J10(-7.475,8.525) J11(-6.475,8.525) J12(-5.475,8.525) J13(-4.475,8.525) J14(-3.475,8.525) J15(-2.475,8.525) J16(-1.475,8.525) J17(-0.475,8.525) J18(0.525,8.525) J19(1.525,8.525) J20(2.525,8.525) J21(3.525,8.525) J22(4.525,8.525) J23(5.525,8.525) J24(6.525,8.525) J25(7.525,8.525) J26(8.525,8.525) J27(9.525,8.525) J28(10.525,8.525) J29(11.525,8.525) J30(12.525,8.525) J31(13.525,8.525) J32(14.525,8.525) J33(15.525,8.525) J34(16.525,8.525) K1(-16.475,7.525) K2(-15.475,7.525) K3(-14.475,7.525) K4(-13.475,7.525) K5(-12.475,7.525) K6(-11.475,7.525) K7(-10.475,7.525) K8(-9.475,7.525) K9(-8.475,7.525) K10(-7.475,7.525) K11(-6.475,7.525) K12(-5.475,7.525) K13(-4.475,7.525) K14(-3.475,7.525) K15(-2.475,7.525) K16(-1.475,7.525) K17(-0.475,7.525) K18(0.525,7.525) K19(1.525,7.525) K20(2.525,7.525) K21(3.525,7.525) K22(4.525,7.525) K23(5.525,7.525) K24(6.525,7.525) K25(7.525,7.525) K26(8.525,7.525) K27(9.525,7.525) K28(10.525,7.525) K29(11.525,7.525) K30(12.525,7.525) K31(13.525,7.525) K32(14.525,7.525) K33(15.525,7.525) K34(16.525,7.525) L1(-16.475,6.525) L2(-15.475,6.525) L3(-14.475,6.525) L4(-13.475,6.525) L5(-12.475,6.525) L6(-11.475,6.525) L7(-10.475,6.525) L8(-9.475,6.525) L9(-8.475,6.525) L10(-7.475,6.525) L11(-6.475,6.525) L12(-5.475,6.525) L13(-4.475,6.525) L14(-3.475,6.525) L15(-2.475,6.525) L16(-1.475,6.525) L17(-0.475,6.525) L18(0.525,6.525) L19(1.525,6.525) L20(2.525,6.525) L21(3.525,6.525) L22(4.525,6.525) L23(5.525,6.525) L24(6.525,6.525) L25(7.525,6.525) L26(8.525,6.525) L27(9.525,6.525) L28(10.525,6.525) L29(11.525,6.525) L30(12.525,6.525) L31(13.525,6.525) L32(14.525,6.525) L33(15.525,6.525) L34(16.525,6.525) M1(-16.475,5.525) M2(-15.475,5.525) M3(-14.475,5.525) M4(-13.475,5.525) M5(-12.475,5.525) M6(-11.475,5.525) M7(-10.475,5.525) M8(-9.475,5.525) M9(-8.475,5.525) M10(-7.475,5.525) M11(-6.475,5.525) M12(-5.475,5.525) M13(-4.475,5.525) M14(-3.475,5.525) M15(-2.475,5.525) M16(-1.475,5.525) M17(-0.475,5.525) M18(0.525,5.525) M19(1.525,5.525) M20(2.525,5.525) M21(3.525,5.525) M22(4.525,5.525) M23(5.525,5.525) M24(6.525,5.525) M25(7.525,5.525) M26(8.525,5.525) M27(9.525,5.525) M28(10.525,5.525) M29(11.525,5.525) M30(12.525,5.525) M31(13.525,5.525) M32(14.525,5.525) M33(15.525,5.525) M34(16.525,5.525) N1(-16.475,4.525) N2(-15.475,4.525) N3(-14.475,4.525) N4(-13.475,4.525) N5(-12.475,4.525) N6(-11.475,4.525) N7(-10.475,4.525) N8(-9.475,4.525) N9(-8.475,4.525) N10(-7.475,4.525) N11(-6.475,4.525) N12(-5.475,4.525) N13(-4.475,4.525) N14(-3.475,4.525) N15(-2.475,4.525) N16(-1.475,4.525) N17(-0.475,4.525) N18(0.525,4.525) N19(1.525,4.525) N20(2.525,4.525) N21(3.525,4.525) N22(4.525,4.525) N23(5.525,4.525) N24(6.525,4.525) N25(7.525,4.525) N26(8.525,4.525) N27(9.525,4.525) N28(10.525,4.525) N29(11.525,4.525) N30(12.525,4.525) N31(13.525,4.525) N32(14.525,4.525) N33(15.525,4.525) N34(16.525,4.525) P1(-16.475,3.525) P2(-15.475,3.525) P3(-14.475,3.525) P4(-13.475,3.525) P5(-12.475,3.525) P6(-11.475,3.525) P7(-10.475,3.525) P8(-9.475,3.525) P9(-8.475,3.525) P10(-7.475,3.525) P11(-6.475,3.525) P12(-5.475,3.525) P13(-4.475,3.525) P14(-3.475,3.525) P15(-2.475,3.525) P16(-1.475,3.525) P17(-0.475,3.525) P18(0.525,3.525) P19(1.525,3.525) P20(2.525,3.525) P21(3.525,3.525) P22(4.525,3.525) P23(5.525,3.525) P24(6.525,3.525) P25(7.525,3.525) P26(8.525,3.525) P27(9.525,3.525) P28(10.525,3.525) P29(11.525,3.525) P30(12.525,3.525) P31(13.525,3.525) P32(14.525,3.525) P33(15.525,3.525) P34(16.525,3.525) R1(-16.475,2.525) R2(-15.475,2.525) R3(-14.475,2.525) R4(-13.475,2.525) R5(-12.475,2.525) R6(-11.475,2.525) R7(-10.475,2.525) R8(-9.475,2.525) R9(-8.475,2.525) R10(-7.475,2.525) R11(-6.475,2.525) R12(-5.475,2.525) R13(-4.475,2.525) R14(-3.475,2.525) R15(-2.475,2.525) R16(-1.475,2.525) R17(-0.475,2.525) R18(0.525,2.525) R19(1.525,2.525) R20(2.525,2.525) R21(3.525,2.525) R22(4.525,2.525) R23(5.525,2.525) R24(6.525,2.525) R25(7.525,2.525) R26(8.525,2.525) R27(9.525,2.525) R28(10.525,2.525) R29(11.525,2.525) R30(12.525,2.525) R31(13.525,2.525) R32(14.525,2.525) R33(15.525,2.525) R34(16.525,2.525) T1(-16.475,1.525) T2(-15.475,1.525) T3(-14.475,1.525) T4(-13.475,1.525) T5(-12.475,1.525) T6(-11.475,1.525) T7(-10.475,1.525) T8(-9.475,1.525) T9(-8.475,1.525) T10(-7.475,1.525) T11(-6.475,1.525) T12(-5.475,1.525) T13(-4.475,1.525) T14(-3.475,1.525) T15(-2.475,1.525) T16(-1.475,1.525) T17(-0.475,1.525) T18(0.525,1.525) T19(1.525,1.525) T20(2.525,1.525) T21(3.525,1.525) T22(4.525,1.525) T23(5.525,1.525) T24(6.525,1.525) T25(7.525,1.525) T26(8.525,1.525) T27(9.525,1.525) T28(10.525,1.525) T29(11.525,1.525) T30(12.525,1.525) T31(13.525,1.525) T32(14.525,1.525) T33(15.525,1.525) T34(16.525,1.525) U1(-16.475,0.525) U2(-15.475,0.525) U3(-14.475,0.525) U4(-13.475,0.525) U5(-12.475,0.525) U6(-11.475,0.525) U7(-10.475,0.525) U8(-9.475,0.525) U9(-8.475,0.525) U10(-7.475,0.525) U11(-6.475,0.525) U12(-5.475,0.525) U13(-4.475,0.525) U14(-3.475,0.525) U15(-2.475,0.525) U16(-1.475,0.525) U17(-0.475,0.525) U18(0.525,0.525) U19(1.525,0.525) U20(2.525,0.525) U21(3.525,0.525) U22(4.525,0.525) U23(5.525,0.525) U24(6.525,0.525) U25(7.525,0.525) U26(8.525,0.525) U27(9.525,0.525) U28(10.525,0.525) U29(11.525,0.525) U30(12.525,0.525) U31(13.525,0.525) U32(14.525,0.525) U33(15.525,0.525) U34(16.525,0.525) V1(-16.475,-0.475) V2(-15.475,-0.475) V3(-14.475,-0.475) V4(-13.475,-0.475) V5(-12.475,-0.475) V6(-11.475,-0.475) V7(-10.475,-0.475) V8(-9.475,-0.475) V9(-8.475,-0.475) V10(-7.475,-0.475) V11(-6.475,-0.475) V12(-5.475,-0.475) V13(-4.475,-0.475) V14(-3.475,-0.475) V15(-2.475,-0.475) V16(-1.475,-0.475) V17(-0.475,-0.475) V18(0.525,-0.475) V19(1.525,-0.475) V20(2.525,-0.475) V21(3.525,-0.475) V22(4.525,-0.475) V23(5.525,-0.475) V24(6.525,-0.475) V25(7.525,-0.475) V26(8.525,-0.475) V27(9.525,-0.475) V28(10.525,-0.475) V29(11.525,-0.475) V30(12.525,-0.475) V31(13.525,-0.475) V32(14.525,-0.475) V33(15.525,-0.475) V34(16.525,-0.475) W1(-16.475,-1.475) W2(-15.475,-1.475) W3(-14.475,-1.475) W4(-13.475,-1.475) W5(-12.475,-1.475) W6(-11.475,-1.475) W7(-10.475,-1.475) W8(-9.475,-1.475) W9(-8.475,-1.475) W10(-7.475,-1.475) W11(-6.475,-1.475) W12(-5.475,-1.475) W13(-4.475,-1.475) W14(-3.475,-1.475) W15(-2.475,-1.475) W16(-1.475,-1.475) W17(-0.475,-1.475) W18(0.525,-1.475) W19(1.525,-1.475) W20(2.525,-1.475) W21(3.525,-1.475) W22(4.525,-1.475) W23(5.525,-1.475) W24(6.525,-1.475) W25(7.525,-1.475) W26(8.525,-1.475) W27(9.525,-1.475) W28(10.525,-1.475) W29(11.525,-1.475) W30(12.525,-1.475) W31(13.525,-1.475) W32(14.525,-1.475) W33(15.525,-1.475) W34(16.525,-1.475) Y1(-16.475,-2.475) Y2(-15.475,-2.475) Y3(-14.475,-2.475) Y4(-13.475,-2.475) Y5(-12.475,-2.475) Y6(-11.475,-2.475) Y7(-10.475,-2.475) Y8(-9.475,-2.475) Y9(-8.475,-2.475) Y10(-7.475,-2.475) Y11(-6.475,-2.475) Y12(-5.475,-2.475) Y13(-4.475,-2.475) Y14(-3.475,-2.475) Y15(-2.475,-2.475) Y16(-1.475,-2.475) Y17(-0.475,-2.475) Y18(0.525,-2.475) Y19(1.525,-2.475) Y20(2.525,-2.475) Y21(3.525,-2.475) Y22(4.525,-2.475) Y23(5.525,-2.475) Y24(6.525,-2.475) Y25(7.525,-2.475) Y26(8.525,-2.475) Y27(9.525,-2.475) Y28(10.525,-2.475) Y29(11.525,-2.475) Y30(12.525,-2.475) Y31(13.525,-2.475) Y32(14.525,-2.475) Y33(15.525,-2.475) Y34(16.525,-2.475)
Top Overlay:
  circle w0.25: c-18.125,17.375 r0.125
  region: -16.475,17.525 -17.475,16.525 -17.475,17.525
  lines w0.2: -17.475,16.525 -16.475,17.525 ; -17.475,-17.475 17.525,-17.475 17.525,17.525 -17.475,17.525 -17.475,-17.475
Mechanical 13:
  lines w0.1: -17.475,-17.475 17.525,-17.475 17.525,17.525 -17.475,17.525 -17.475,-17.475
Mechanical 15:
  lines w0.05: -17.975,-17.975 18.025,-17.975 18.025,18.025 -17.975,18.025 -17.975,-17.975
  lines w0.1: -0.475,0.025 0.525,0.025 ; 0.025,-0.475 0.025,0.525
3D body "BGA1156C100P34X34_3500X3500X335.step": height 3.35, standoff 0, extent -17.5,-17.475 17.5,17.525